# Altium footprint library Connectors.PcbLib: 76 footprints (part 4 of 5)
Each footprint in its own frame and in the unit in brackets; x right, y up, seen from the top. Pads: shape width x height; smd on the part's side, far side on the other; paste and mask are expansions set on the pad; w line width, h text height; cw(c..) or ccw(c..) is an arc to the next point about the centre after c.
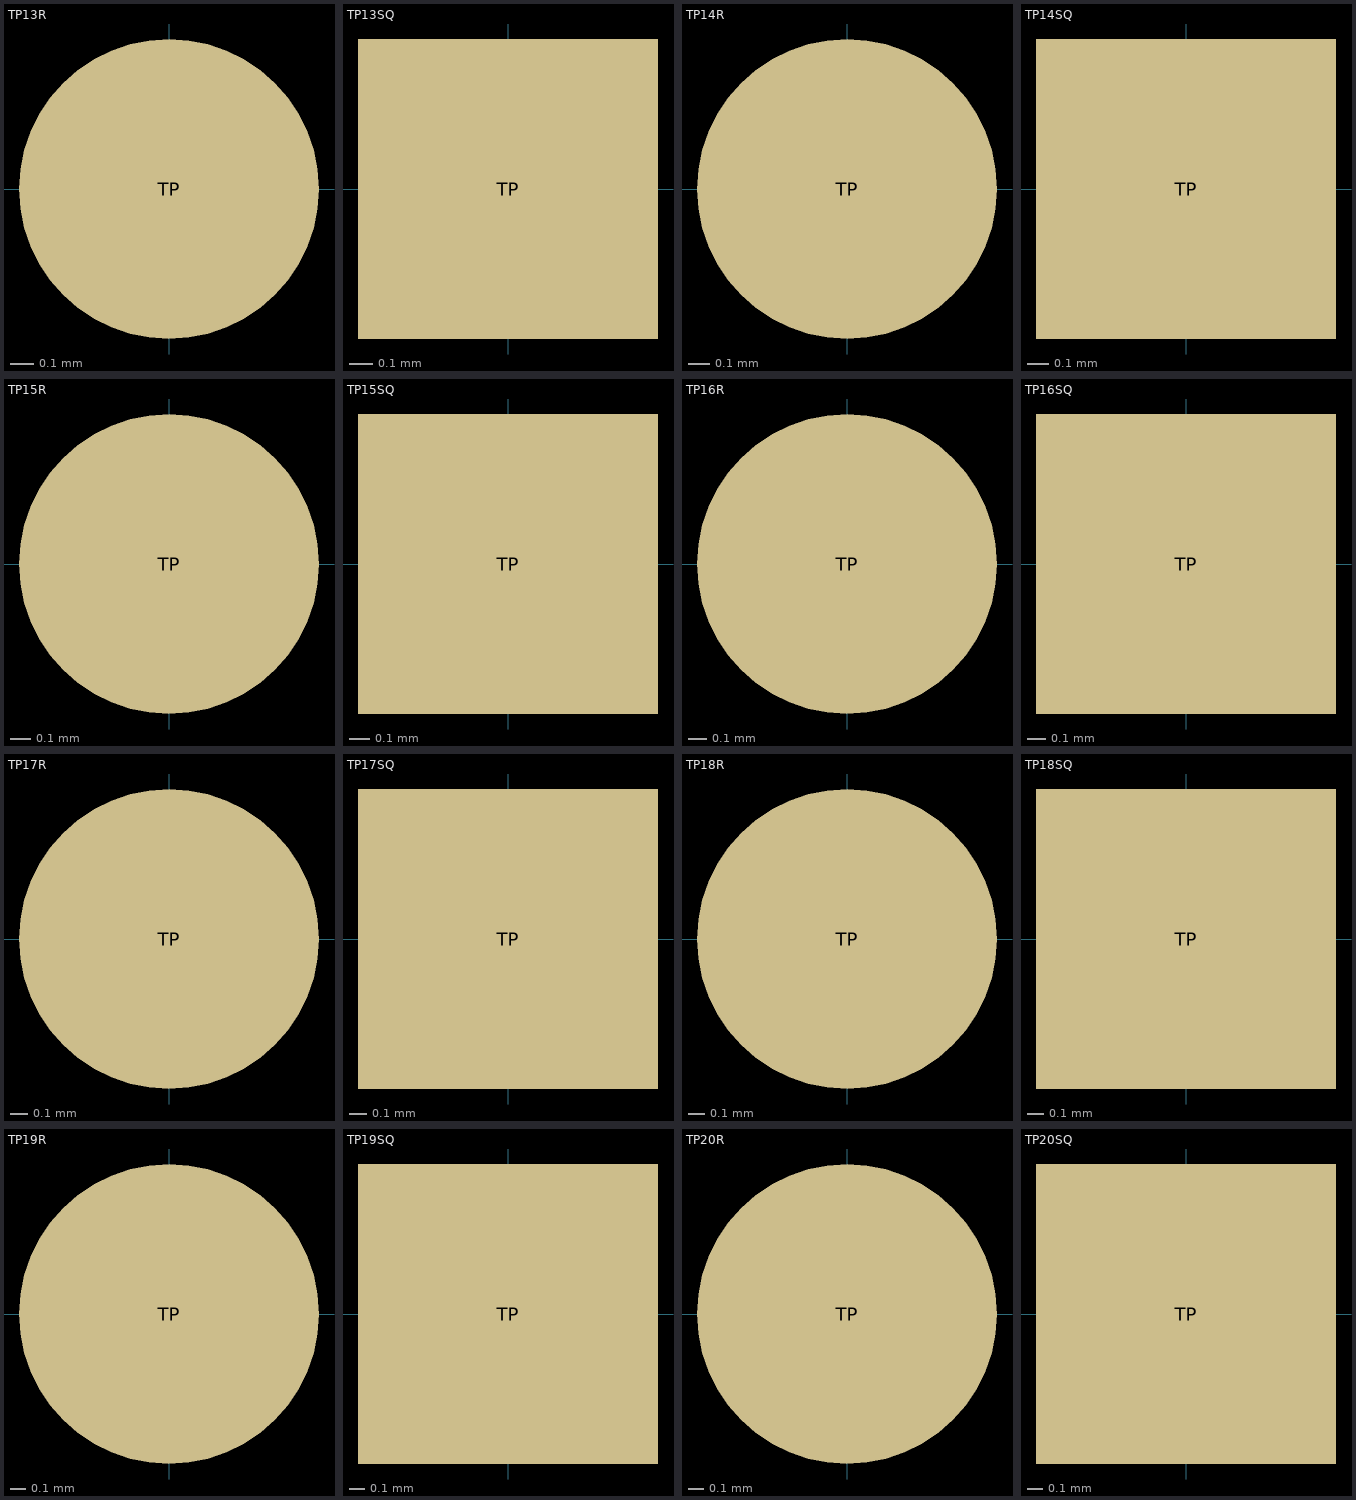
[diagram p3: the footprints below, top view; thin cyan lines are the x and y axes]

## TP13R [mm]
pads (1):
  rrect100% 1.3x1.3 smd paste-0.65: TP(0,0)

## TP13SQ [mm]
pads (1):
  rect 1.3x1.3 smd paste-0.65: TP(0,0)

## TP14R [mm]
pads (1):
  rrect100% 1.4x1.4 smd paste-0.7: TP(0,0)

## TP14SQ [mm]
pads (1):
  rect 1.4x1.4 smd paste-0.7: TP(0,0)

## TP15R [mm]
pads (1):
  rrect100% 1.5x1.5 smd paste-0.75: TP(0,0)

## TP15SQ [mm]
pads (1):
  rect 1.5x1.5 smd paste-0.75: TP(0,0)

## TP16R [mm]
pads (1):
  rrect100% 1.6x1.6 smd paste-0.8: TP(0,0)

## TP16SQ [mm]
pads (1):
  rect 1.6x1.6 smd paste-0.8: TP(0,0)

## TP17R [mm]
pads (1):
  rrect100% 1.7x1.7 smd paste-0.85: TP(0,0)

## TP17SQ [mm]
pads (1):
  rect 1.7x1.7 smd paste-0.85: TP(0,0)

## TP18R [mm]
pads (1):
  rrect100% 1.8x1.8 smd paste-0.9: TP(0,0)

## TP18SQ [mm]
pads (1):
  rect 1.8x1.8 smd paste-0.9: TP(0,0)

## TP19R [mm]
pads (1):
  rrect100% 1.9x1.9 smd paste-0.95: TP(0,0)

## TP19SQ [mm]
pads (1):
  rect 1.9x1.9 smd paste-0.95: TP(0,0)

## TP20R [mm]
pads (1):
  rrect100% 2x2 smd paste-1: TP(0,0)

## TP20SQ [mm]
pads (1):
  rect 2x2 smd paste-1: TP(0,0)